# Altium footprint library North POLE.PcbLib: 419 footprints (part 21 of 27)
Each footprint in its own frame and in the unit in brackets; x right, y up, seen from the top. Pads: shape width x height; smd on the part's side, far side on the other; paste and mask are expansions set on the pad; w line width, h text height; cw(c..) or ccw(c..) is an arc to the next point about the centre after c.
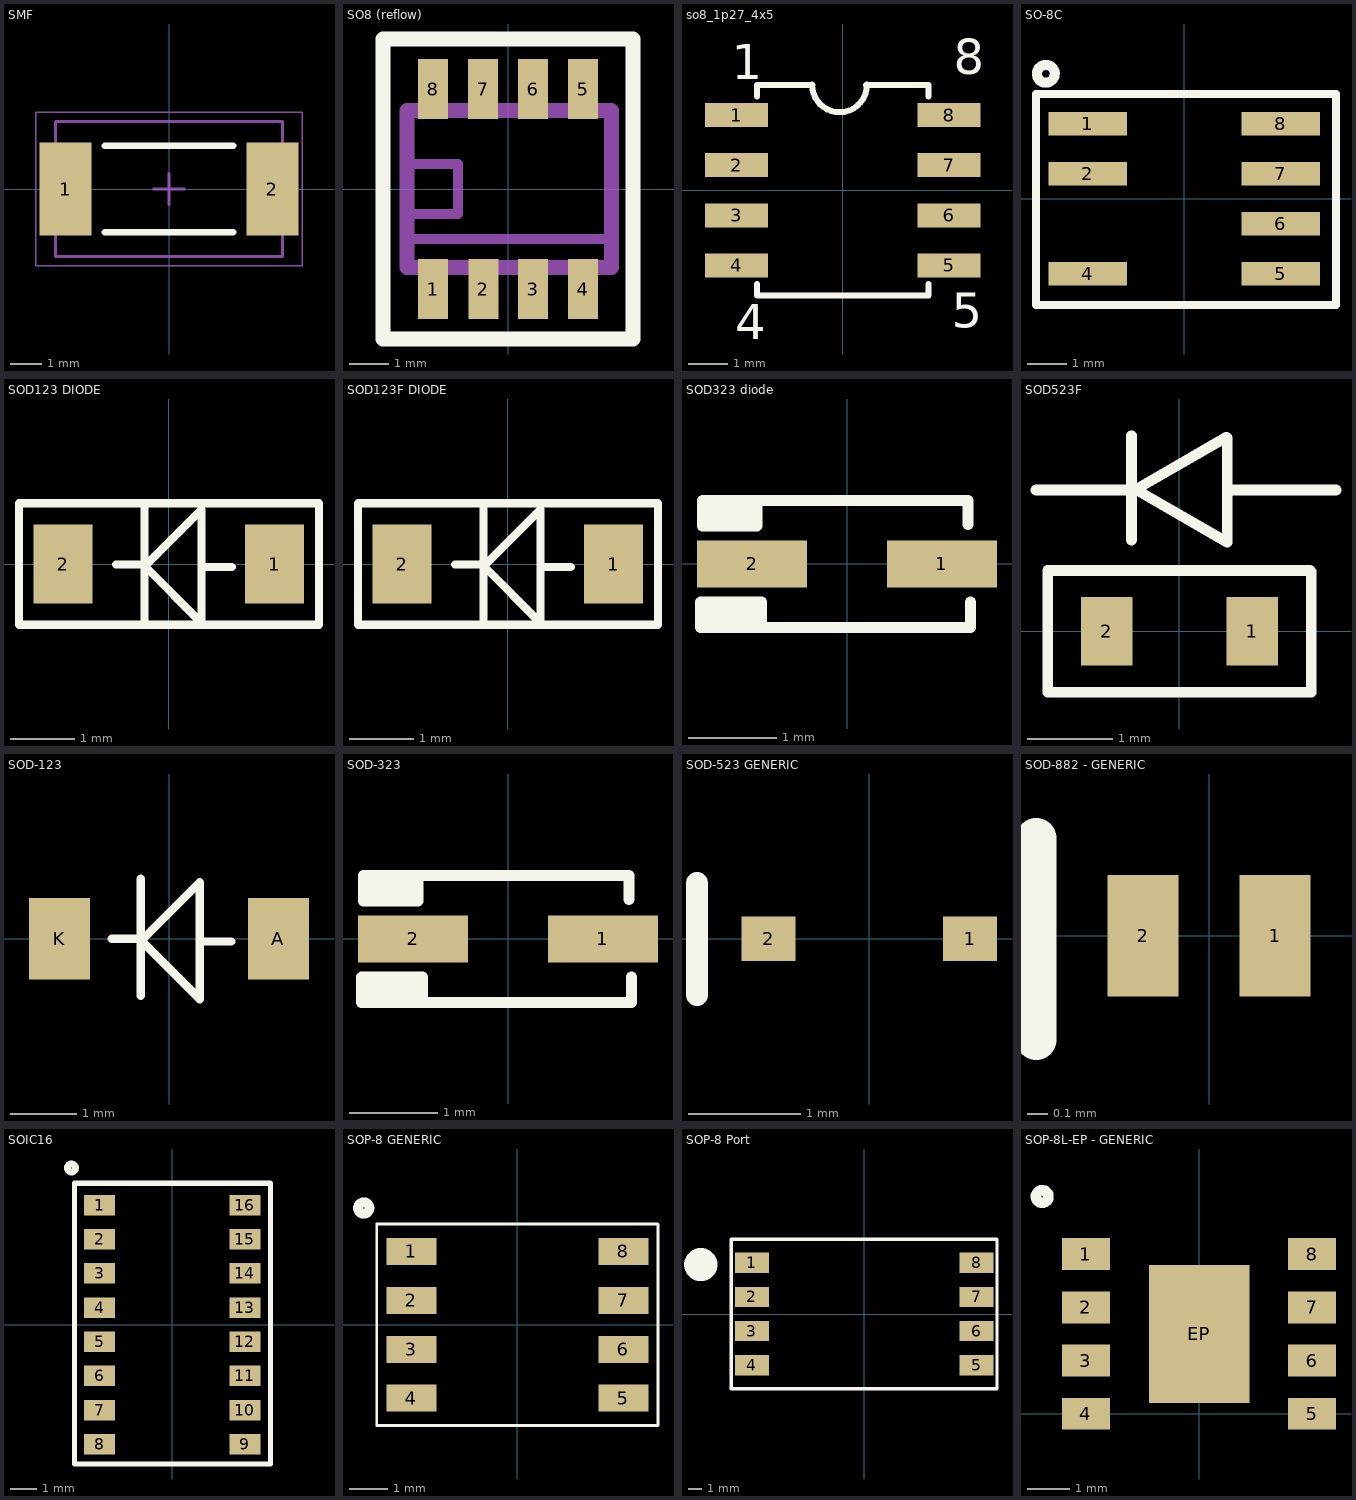
[diagram p20: the footprints below, top view; thin cyan lines are the x and y axes]

## SMF [mm] "Chip Resistor, 2-Leads, Body 7.24x4.32mm, IPC Medium Density"
height 3.05
pads (2):
  rect 1.65x2.97 smd: 1(-3.305,0) 2(3.305,0)
Top Overlay:
  lines w0.2: -2.05,-1.385 2.05,-1.385 ; -2.05,1.385 2.05,1.385
Mechanical 13:
  lines w0.1: -3.62,-2.16 3.62,-2.16 3.62,2.16 -3.62,2.16 -3.62,-2.16
Mechanical 15:
  lines w0.05: -4.25,-2.45 4.25,-2.45 4.25,2.45 -4.25,2.45 -4.25,-2.45
  lines w0.1: -0.5,0 0.5,0 ; 0,-0.5 0,0.5
3D body: height 3.05, standoff 0, extent 2.32,-2.16 3.62,2.16
3D body: height 3.05, standoff 0, extent -3.62,-2.16 -2.32,2.16
3D body: height 3.05, standoff 0, extent -2.32,-2.16 2.32,2.16

## SO8 (reflow) [mil]
pads (8):
  rect 30x60 smd paste+0 mask+8: 1(-75,-100) 2(-24.7,-100) 3(25,-100) 4(75,-100) 5(75,100) 6(25,100) 7(-25,100) 8(-75,100)
Top Overlay:
  lines w15: -125,-150 -125,150 125,150 125,-150 -125,-150
Mechanical 1:
  lines w1: -100.98,-78.74 -100.98,78.74 103.74,78.74 103.74,-78.74 -100.98,-78.74
Mechanical 2:
  lines w1: -125,-150 125,-150 125,150 -125,150 -125,-150
Mechanical 5:
  lines w1: -125,-150 125,-150 125,150 -125,150 -125,-150
Mechanical 6:
  lines w1: -96.46,-76.77 100,-76.77 100,76.77 -96.46,76.77 -96.46,-76.77
  lines w10: -100,-50 100,-50 ; -100,-25 -50,-25 -50,25 -100,25
  lines w15: -100.98,-78.74 -100.98,78.74 103.74,78.74 103.74,-78.74 -100.98,-78.74

## so8_1p27_4x5 [mil]
pads (8):
  rect 63x24 smd: 1(-106.3,75) 2(-106.3,25) 3(-106.3,-25) 4(-106.3,-75) 5(106.3,-75) 6(106.3,-25) 7(106.3,25) 8(106.3,75)
Top Overlay:
  lines w6: -85.7,-93.8 -85.7,-105.4 85.7,-105.4 85.7,-93.8 ; -85.7,93.8 -85.7,105.4 -30.2,105.4 ; -30.7,105.8 -30.7,105.3 ccw(c-3.37,105.33) -3.3,78 ccw(c-3.35,105.35) 24,105.4 24,105.9 ; 23.3,105.4 85.7,105.4 85.7,93.8
  text "8" at 111,116.2 h35
  text "5" at 109,-137.67 h35
  text "4" at -107.5,-148.7 h35
  text "1" at -111.3,111.2 h35
3D body: height 68.9, standoff 0, extent -118.11,-96.46 118.11,96.46

## SO-8C [mm]
pads (7):
  rect 2x0.6 smd: 1(-2.45,1.905) 2(-2.45,0.635) 4(-2.45,-1.905) 5(2.45,-1.905) 6(2.45,-0.635) 7(2.45,0.635) 8(2.45,1.905)
Top Overlay:
  lines w0.2: -3.765,-2.7 -3.765,2.66 3.855,2.66 3.855,-2.7 -3.765,-2.7
  lines w0.254: -3.369,3.349 ccw(c-3.515,3.175) -3.348,3.329
3D body: height 1.75, standoff 0, extent -3,-2.45 3,2.45

## SOD123 DIODE [mil]
pads (2):
  rect 36x48 smd mask+3.15: 1(64.49,0) 2(-64.5,0)
Top Overlay:
  lines w5: -32.2,-0.27 -14.02,-0.27 ; -14.96,-33.93 -14.96,35.16 ; -14.62,-1.39 19.88,-35.9 19.88,33.2 -14.62,-1.31 ; 20.62,-1.85 38.31,-1.85 ; -91.5,-37.1 -91.5,37.1 91.6,37.1 91.6,-37.1 -91.5,-37.1
3D body: height 58.07, standoff 0.98, extent -76,-34.46 75.58,32.47

## SOD123F DIODE [mil]
pads (2):
  rect 36x48 smd mask+3.15: 1(64.49,0) 2(-64.5,0)
Top Overlay:
  lines w5: -32.2,-0.27 -14.02,-0.27 ; -14.96,-33.93 -14.96,35.16 ; -14.62,-1.39 19.88,-35.9 19.88,33.2 -14.62,-1.31 ; 20.62,-1.85 38.31,-1.85 ; -91.5,-37.1 91.6,-37.1 91.6,37.1 -91.5,37.1 -91.5,-37.1
3D body: height 58.07, standoff 0.98, extent -76,-34.46 75.58,32.47

## SOD323 diode [mm]
pads (2):
  rect 1.25x0.53 smd mask+0.08: 1(1.079,0) 2(-1.079,0)
Top Overlay:
  rectangle: -1.662,-0.721 -0.973,-0.434
  rectangle: -1.643,0.434 -1.026,0.721
  lines w0.127: -1.375,-0.721 1.402,-0.721 1.402,-0.434 ; -1.356,0.721 1.374,0.721 1.374,0.452 ; -1.662,-0.721 -1.662,-0.434 -0.973,-0.434 -0.973,-0.721 -1.662,-0.721 ; -1.643,0.434 -1.643,0.721 -1.026,0.721 -1.026,0.434 -1.643,0.434
3D body: height 1, standoff 0.01, extent -1.232,-0.599 1.268,0.651

## SOD523F [mm]
pads (2):
  rect 0.6x0.8 smd mask+0.08: 1(0.85,0) 2(-0.85,0)
Top Overlay:
  lines w0.127: -1.676,1.651 -0.457,1.651 ; -0.559,1.067 -0.559,2.286 ; 0.547,1.048 -0.509,1.658 0.547,2.267 ; 0.559,1.041 0.559,2.261 ; 0.61,1.651 1.829,1.651 ; 1.539,-0.711 -1.539,-0.711 -1.539,0.711 1.524,0.711 1.539,0.696 1.539,-0.686
3D body: height 1, standoff 0, extent -1.539,-0.711 1.539,0.711

## SOD-123 [mil]
pads (2):
  rect 36x48 smd mask+3.15: A(64.49,0) K(-64.5,0)
Top Overlay:
  lines w5: -33.86,-0.12 -15.68,-0.12 ; -16.61,-33.77 -16.61,35.32 ; -16.28,-1.23 18.23,-35.74 18.23,33.35 -16.28,-1.16 ; 18.97,-1.69 36.65,-1.69
3D body: height 58.07, standoff 0.98, extent -76,-34.46 75.58,32.47

## SOD-323 [mm] "Schottky diode"
pads (2):
  rect 1.25x0.53 smd mask+0.08: 1(1.079,0) 2(-1.079,0)
Top Overlay:
  rectangle: -1.643,0.434 -1.026,0.721
  rectangle: -1.662,-0.721 -0.973,-0.434
  lines w0.127: -1.375,-0.721 1.402,-0.721 1.402,-0.434 ; -1.356,0.721 1.374,0.721 1.374,0.452 ; -1.662,-0.721 -0.973,-0.721 -0.973,-0.434 -1.662,-0.434 -1.662,-0.721 ; -1.643,0.434 -1.026,0.434 -1.026,0.721 -1.643,0.721 -1.643,0.434
3D body: height 1, standoff 0.01, extent -1.232,-0.599 1.268,0.651

## SOD-523 GENERIC [mm]
pads (2):
  rect 0.48x0.4 smd mask+0.08: 1(0.9,0) 2(-0.9,0)
Top Overlay:
  lines w0.2: -1.539,-0.5 -1.539,0.494

## SOD-882 - GENERIC [mm]
pads (2):
  rect 0.35x0.6 smd mask+0.08: 1(0.325,0) 2(-0.325,0)
Top Overlay:
  lines w0.2: -0.853,-0.513 -0.853,0.481

## SOIC16 [mil]
pads (16):
  rect 45x30 smd: 1(-106.3,175) 2(-106.3,125) 3(-106.3,75) 4(-106.3,25) 5(-106.3,-25) 6(-106.3,-75) 7(-106.3,-125) 8(-106.3,-175) 9(106.3,-175) 10(106.3,-125) 11(106.3,-75) 12(106.3,-25) 13(106.3,25) 14(106.3,75) 15(106.3,125) 16(106.3,175)
Top Overlay:
  lines w7.87: -142.95,-203.86 -142.95,206.73 143.86,206.73 143.86,-203.86 -142.95,-203.86
  lines w10: -143.85,233.81 ccw(c-147.43,229.21) -143,233
3D body: height 55.12, standoff 0, extent -115.31,-195.87 120.91,193.89

## SOP-8 GENERIC [mm]
pads (8):
  rect 1.3x0.7 smd: 1(-2.75,1.905) 2(-2.75,0.635) 3(-2.75,-0.635) 4(-2.75,-1.905) 5(2.75,-1.905) 6(2.75,-0.635) 7(2.75,0.635) 8(2.75,1.905)
Top Overlay:
  lines w0.076: -3.649,-2.608 -3.649,2.611 ; -3.649,2.619 3.638,2.619 3.649,2.608 3.649,-2.611 ; -3.638,-2.619 3.651,-2.619
  lines w0.254: -3.898,3.15 ccw(c-3.988,3.033) -3.876,3.129

## SOP-8 Port [mm]
pads (8):
  rect 2.54x1.52 smd: 1(-8.382,3.81) 2(-8.382,1.27) 3(-8.382,-1.27) 4(-8.382,-3.81) 5(8.382,-3.81) 6(8.382,-1.27) 7(8.382,1.27) 8(8.382,3.81)
Top Overlay:
  circle w1.905: c-12.192,3.683 r0.284
  lines w0.254: -9.906,-5.588 -9.906,4.826 -9.906,5.588 9.906,5.588 9.906,-5.588 -9.906,-5.588
3D body: height 13.21, standoff 6.73, extent -1.659,-1.659 1.659,1.659
3D body: height 6.73, standoff 0.05, extent -5.842,-5.334 5.334,5.334

## SOP-8L-EP - GENERIC [mil]
pads (9):
  rect 45x30 smd: 1(-106.3,150) 2(-106.3,100) 3(-106.3,50) 4(-106.3,0) 5(106.3,0) 6(106.3,50) 7(106.3,100) 8(106.3,150)
  rect 94.49x129.92 smd: EP(0,75)
Top Overlay:
  lines w10: -143.85,208.81 ccw(c-147.43,204.21) -143,208
3D body: height 68.9, standoff 0, extent -118.11,-21.45 118.11,171.46